# Altium footprint library SoM_Artix.PcbLib: 239 footprints (part 6 of 15)
Each footprint in its own frame and in the unit in brackets; x right, y up, seen from the top. Pads: shape width x height; smd on the part's side, far side on the other; paste and mask are expansions set on the pad; w line width, h text height; cw(c..) or ccw(c..) is an arc to the next point about the centre after c.
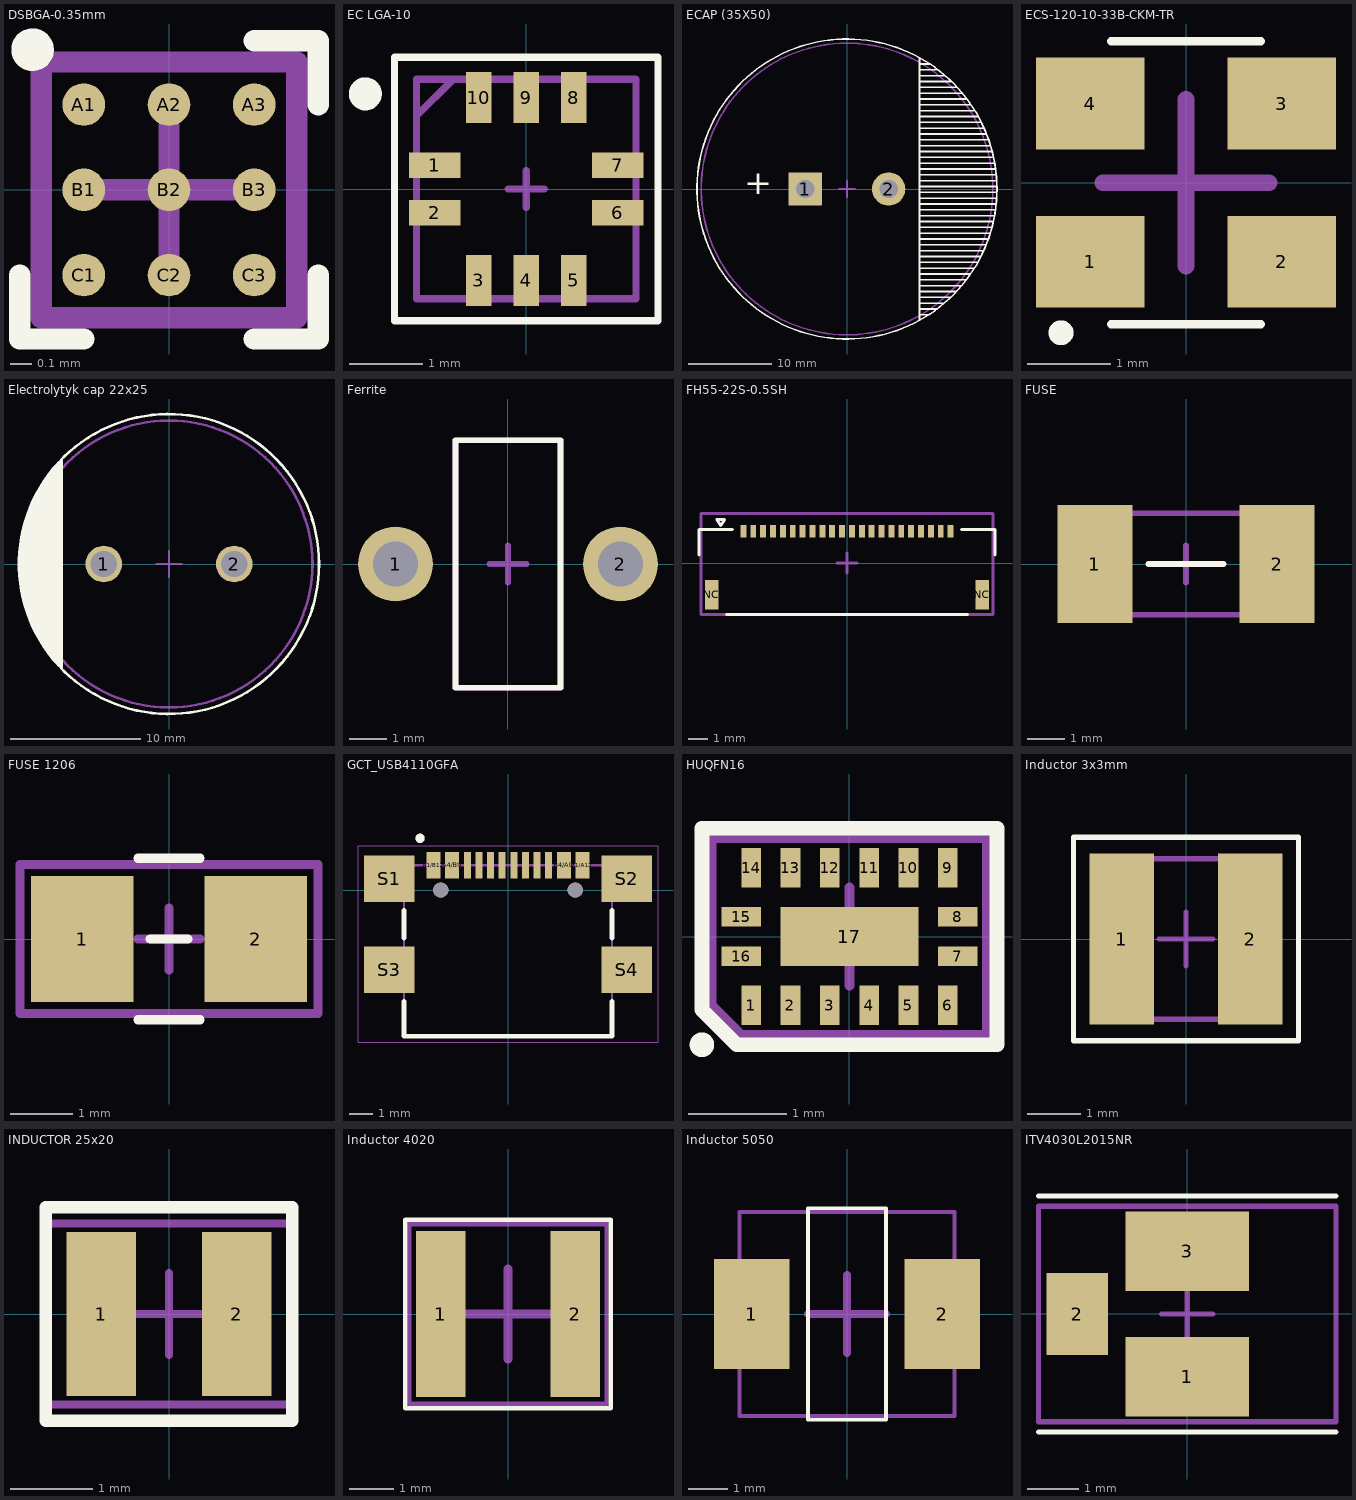
[diagram p5: the footprints below, top view; thin cyan lines are the x and y axes]

## DSBGA-0.35mm [mm]
pads (9):
  round 0.2 smd mask+0.05: A1(-0.4,0.4) A2(0,0.4) A3(0.4,0.4) B1(-0.4,0) B2(0,0) B3(0.4,0) C1(-0.4,-0.4) C2(0,-0.4) C3(0.4,-0.4)
Top Overlay:
  circle w0.1: c-0.64,0.658 r0.05
  lines w0.1: -0.7,-0.4 -0.7,-0.7 -0.4,-0.7 ; 0.4,-0.7 0.7,-0.7 0.7,-0.4 ; 0.4,0.7 0.7,0.7 0.7,0.4
Mechanical 15:
  lines w0.1: -0.3,0 0.3,0 ; 0,-0.3 0,0.3 ; -0.6,-0.6 -0.6,0.6 0.6,0.6 0.6,-0.6 -0.6,-0.6
3D body "DSBGA9_YBJ_TEX.step": height 0.36, standoff 0, extent -0.597,-0.597 0.597,0.597

## EC LGA-10 [mm] "3mmx3mmx1.45mm"
height 1.45
pads (10):
  rect 0.7x0.35 smd: 1(-1.25,0.325) 2(-1.25,-0.325) 6(1.25,-0.325) 7(1.25,0.325)
  rect 0.35x0.7 smd: 3(-0.65,-1.25) 4(0,-1.25) 5(0.65,-1.25) 8(0.65,1.25) 9(0,1.25) 10(-0.65,1.25)
Top Overlay:
  circle w0.25: c-2.2,1.3 r0.1
  lines w0.1: -1.8,-1.8 -1.8,1.8 1.8,1.8 1.8,-1.8 -1.8,-1.8
Mechanical 15:
  lines w0.1: -1.5,1 -1,1.5 ; -0.25,0 0.25,0 ; 0,-0.25 0,0.25 ; -1.5,-1.5 -1.5,1.5 1.5,1.5 1.5,-1.5 -1.5,-1.5

## ECAP (35X50) [mm] "ECAP (35X50)"
height 60.1
pads (2):
  rect 4x4 hole 2.2: 1(-5,0)
  round 4 hole 2.2: 2(5,0)
Top Overlay:
  circle w0.2: c0,0 r18
  lines w0.2: 8.7,-15.7 8.7,15.7 ; 8.7,-15.1 9.8,-15.1 ; 8.7,-14.4 10.8,-14.4 ; 8.7,-13.7 11.6,-13.7 ; 8.7,-13 12.4,-13 ; 8.7,-12.3 13.1,-12.3 ; 8.7,-11.6 13.7,-11.6 ; 8.7,-10.9 14.3,-10.9 ; 8.7,-10.2 14.8,-10.2 ; 8.7,-9.5 15.2,-9.5 ; 8.7,-8.8 15.6,-8.8 ; 8.7,-8.1 16,-8.1 ; 8.7,-7.4 16.4,-7.4 ; 8.7,-6.7 16.7,-6.7 ; 8.7,-6 16.9,-6 ; 8.7,-5.3 17.1,-5.3 ; 8.7,-4.6 17.4,-4.6 ; 8.7,-3.9 17.5,-3.9 ; 8.7,-3.2 17.7,-3.2 ; 8.7,-2.5 17.8,-2.5 ; 8.7,-1.8 17.9,-1.8 ; 8.7,-1.1 17.9,-1.1 ; 8.7,-0.4 17.9,-0.4 ; 8.7,0.3 17.9,0.3 ; 8.7,1 17.9,1 ; 8.7,1.7 17.9,1.7 ; 8.7,2.4 17.8,2.4 ; 8.7,3.1 17.7,3.1 ; 8.7,3.8 17.5,3.8 ; 8.7,4.5 17.4,4.5 ; 8.7,5.2 17.2,5.2 ; 8.7,5.9 17,5.9 ; 8.7,6.6 16.7,6.6 ; 8.7,7.3 16.4,7.3 ; 8.7,8 16.1,8 ; 8.7,8.7 15.7,8.7 ; 8.7,9.4 15.3,9.4 ; 8.7,10.1 14.8,10.1 ; 8.7,10.8 14.3,10.8 ; 8.7,11.5 13.8,11.5 ; 8.7,12.2 13.2,12.2 ; 8.7,12.9 12.5,12.9 ; 8.7,13.6 11.7,13.6 ; 8.7,14.3 10.8,14.3 ; 8.7,15 9.9,15
  text "+" at -12.3,-1.563 h5
Mechanical 15:
  circle w0.2: c0,0 r17.5
  lines w0.2: -1,0 1,0 ; 0,-1 0,1
3D body "конденсатор.STEP": height 60.1, standoff -6.2, extent -17.5,-17.5 17.5,17.5

## ECS-120-10-33B-CKM-TR [mm]
pads (4):
  rect 1.3x1.1 smd mask+0.05: 1(-1.15,-0.95) 2(1.15,-0.95) 3(1.15,0.95) 4(-1.15,0.95)
Top Overlay:
  circle w0.2: c-1.5,-1.8 r0.05
  lines w0.1: -0.9,-1.7 0.9,-1.7 ; -0.9,1.7 0.9,1.7
Mechanical 15:
  lines w0.2: -1,0 1,0 ; 0,-1 0,1
3D body "ECS-120-10-33B-CKM-TR.step": height 0.8, standoff 0, extent -1.6,-1.25 1.6,1.25

## Electrolytyk cap 22x25 [mm]
height 25
pads (2):
  round 2.8 hole 2: 1(-5,0) 2(5,0)
Top Overlay:
  circle w0.2: c0,0 r11.5
  region: -8.2,8 -9.2,7 -9.2,6.9 -9.4,6.7 -9.4,6.5 -9.9,6 -9.9,5.8 -10.2,5.5 -10.2,5.1 -10.5,4.8 -10.5,4.5 -11.1,3.1 -11.5,0.4 -11.3,-2.1 -10.5,-4.7 -9.1,-7.1 -8.2,-8
  lines w0.15: -8.2,-8 -8.2,8
Mechanical 13:
  circle w0.2: c0,0 r11
  lines w0.15: -1,0 1,0 ; 0,-1 0,1
3D body "elh686m400aq1aa.stp": height 27.5, standoff -6.29, extent -16.263,-16.263 16.263,16.263

## Ferrite [mm]
pads (2):
  round 2 hole 1.2: 1(-3,0) 2(3,0)
Top Overlay:
  lines w0.15: -1.4,-3.3 1.4,-3.3 1.4,3.3 -1.4,3.3 -1.4,-3.3
Mechanical 13:
  lines w0.15: -0.5,0 0.5,0 ; 0,-0.5 0,0.5 ; -1.4,-3.3 -1.4,3.3 1.4,3.3 1.4,-3.3 -1.4,-3.3

## FH55-22S-0.5SH [mm]
pads (24):
  rect 0.3x0.65 smd mask+0.07: 1(-5.25,1.613) 2(-4.75,1.613) 3(-4.25,1.613) 4(-3.75,1.613) 5(-3.25,1.613) 6(-2.75,1.613) 7(-2.25,1.613) 8(-1.75,1.613) 9(-1.25,1.613) 10(-0.75,1.613) 11(-0.25,1.613) 12(0.25,1.613) 13(0.75,1.613) 14(1.25,1.613) 15(1.75,1.613) 16(2.25,1.613) 17(2.75,1.613) 18(3.25,1.613) 19(3.75,1.613) 20(4.25,1.613) 21(4.75,1.613) 22(5.25,1.613)
  rect 0.7x1.5 smd mask+0.07: NC(-6.85,-1.612) NC(6.85,-1.612)
Top Overlay:
  lines w0.15: -7.5,0.4 -7.5,1.7 -5.8,1.7 ; -6.1,-2.6 6.1,-2.6 ; 5.8,1.7 7.5,1.7 7.5,0.4 ; -6.6,2.2 -6.4,1.9 -6.2,2.2 -6.6,2.2
Mechanical 15:
  lines w0.15: -0.5,0 0.5,0 ; 0,-0.5 0,0.5 ; -7.4,-2.6 -7.4,2.5 7.4,2.5 7.4,-2.6 -7.4,-2.6
3D body "FH55-22S-0.5SH.stp": height 1.49, standoff -0.01, extent -7.2,-2.45 7.2,1.8

## FUSE [mm]
height 3
pads (2):
  rect 2x3.15 smd: 1(-2.43,0) 2(2.43,0)
Top Overlay:
  lines w0.15: -1,0 1,0
Mechanical 13:
  lines w0.15: -0.5,0 0.5,0 ; 0,-0.5 0,0.5 ; -3.05,-1.35 3.05,-1.35 3.05,1.35 -3.05,1.35 -3.05,-1.35
3D body "User Library-FUSE_NANO2.step": height 2.7, standoff 0, extent -3.05,-1.35 3.05,1.35

## FUSE 1206 [mm]
pads (2):
  rect 1.65x2.03 smd: 1(-1.4,0) 2(1.4,0)
Top Overlay:
  lines w0.15: -0.5,-1.3 0.5,-1.3 ; -0.5,1.3 0.5,1.3 ; -0.3,0 0.3,0
Mechanical 15:
  lines w0.15: -0.5,0 0.5,0 ; 0,-0.5 0,0.5 ; -2.4,-1.2 -2.4,1.2 2.4,1.2 2.4,-1.2 -2.4,-1.2
3D body "User Library-SF-1206F.SLDPRT": height 0.61, standoff 0, extent -1.55,-0.775 1.55,0.775

## GCT_USB4110GFA [mm]
pads (18):
  rect 0.6x1.15 smd: A1/B12(-3.2,1.075) A4/B9(-2.4,1.075) B1/A12(3.2,1.075) B4/A9(2.4,1.075)
  rect 0.3x1.15 smd: A5(-1.25,1.075) A6(-0.25,1.075) A7(0.25,1.075) A8(1.25,1.075) B5(1.75,1.075) B6(0.75,1.075) B7(-0.75,1.075) B8(-1.75,1.075)
  rect 2.18x2 smd: S1(-5.11,0.5) S2(5.11,0.5) S3(-5.11,-3.43) S4(5.11,-3.43)
  round 0.65 hole 0.65 unplated: ""(-2.89,0) ""(2.89,0)
Top Overlay:
  circle w0.2: c-3.78,2.23 r0.1
  lines w0.2: -4.47,-4.79 -4.47,-6.28 4.47,-6.28 4.47,-4.79 ; -4.47,-2.07 -4.47,-0.86 ; 4.47,-2.07 4.47,-0.86
Mechanical 13:
  circle w0.2: c-3.78,2.23 r0.1
  lines w0.1: -4.47,-6.28 4.47,-6.28 4.47,1.07 -4.47,1.07 -4.47,-6.28
Mechanical 15:
  lines w0.05: -6.45,-6.53 -6.45,1.9 6.45,1.9 6.45,-6.53 -6.45,-6.53
3D body "step_temp.STEP": height 3.26, standoff -0.63, extent -5.65,-6.28 5.65,1.42

## HUQFN16 [mm] "1.6x2.4x0.5 mm"
pads (17):
  rect 0.2x0.4 smd mask+0.05: 1(-1,-0.7) 2(-0.6,-0.7) 3(-0.2,-0.7) 4(0.2,-0.7) 5(0.6,-0.7) 6(1,-0.7) 9(1,0.7) 10(0.6,0.7) 11(0.2,0.7) 12(-0.2,0.7) 13(-0.6,0.7) 14(-1,0.7)
  rect 0.4x0.2 smd mask+0.05: 7(1.1,-0.2) 8(1.1,0.2) 15(-1.1,0.2) 16(-1.1,-0.2)
  rect 1.4x0.6 smd mask+0.05: 17(0,0)
Top Overlay:
  circle w0.15: c-1.5,-1.1 r0.05
  lines w0.15: -1.5,-0.745 -1.5,1.1 1.5,1.1 1.5,-1.1 -1.145,-1.1 -1.5,-0.745
Mechanical 15:
  lines w0.1: -0.5,0 0.5,0 ; 0,-0.5 0,0.5 ; -1.4,-0.7 -1.4,1 1.4,1 1.4,-1 -1.1,-1 -1.4,-0.7
3D body "HUQFN16.STEP": height 0.53, standoff 0, extent -1.2,-0.8 1.2,0.8

## Inductor 3x3mm [mm]
height 1
pads (2):
  rect 1.2x3.2 smd: 1(-1.2,0) 2(1.2,0)
Top Overlay:
  lines w0.1: -2.1,-1.9 -2.1,1.9 2.1,1.9 2.1,-1.9 -2.1,-1.9
Mechanical 13:
  lines w0.1: -0.5,0 0.5,0 ; 0,-0.5 0,0.5 ; -1.5,-1.5 1.5,-1.5 1.5,1.5 -1.5,1.5 -1.5,-1.5
3D body "User Library-Murata_LQH3NP_M0(1212).step": height 1.4, standoff -0.01, extent -1.51,-1.5 1.51,1.5

## INDUCTOR 25x20 [mm]
pads (2):
  rect 0.85x2 smd: 1(-0.825,0) 2(0.825,0)
Top Overlay:
  lines w0.15: -1.5,-1.3 1.5,-1.3 1.5,1.3 -1.5,1.3 -1.5,-1.3
Mechanical 13:
  lines w0.1: -0.5,0 0.5,0 ; 0,-0.5 0,0.5 ; -1.5,-1.1 1.5,-1.1 1.5,1.1 -1.5,1.1 -1.5,-1.1

## Inductor 4020 [mm]
pads (2):
  rect 1.1x3.7 smd: 1(-1.5,0) 2(1.5,0)
Top Overlay:
  lines w0.1: -2.3,-2.1 2.3,-2.1 2.3,2.1 -2.3,2.1 -2.3,-2.1
Mechanical 13:
  lines w0.1: -2.2,-2 2.2,-2 2.2,2 -2.2,2 -2.2,-2
  lines w0.2: -1,0 1,0 ; 0,-1 0,1

## Inductor 5050 [mm]
height 2
pads (2):
  rect 1.92x2.8 smd: 1(-2.43,0) 2(2.43,0)
Top Overlay:
  lines w0.1: -1,-2.7 1,-2.7 1,2.7 -1,2.7 -1,-2.7
Mechanical 13:
  lines w0.1: -2.75,-2.6 -2.75,2.6 2.75,2.6 2.75,-2.6 -2.75,-2.6
  lines w0.2: -1,0 1,0 ; 0,-1 0,1
3D body "ihlp2020bzer6r8m01.stp": height 1.95, standoff 0.03, extent -2.751,-2.573 2.7,2.573

## ITV4030L2015NR [mm]
pads (3):
  rect 2.4x1.55 smd mask+0.05: 1(0,-1.225) 3(0,1.225)
  rect 1.2x1.6 smd mask+0.05: 2(-2.15,0)
Top Overlay:
  lines w0.1: -2.9,-2.3 2.9,-2.3 ; -2.9,2.3 2.9,2.3
Mechanical 15:
  lines w0.1: -0.5,0 0.5,0 ; 0,-0.5 0,0.5 ; -2.9,-2.1 -2.9,2.1 2.9,2.1 2.9,-2.1 -2.9,-2.1